# Altium footprint library Connectors_rus.PcbLib: 53 footprints (part 4 of 4)
Each footprint in its own frame and in the unit in brackets; x right, y up, seen from the top. Pads: shape width x height; smd on the part's side, far side on the other; paste and mask are expansions set on the pad; w line width, h text height; cw(c..) or ccw(c..) is an arc to the next point about the centre after c.
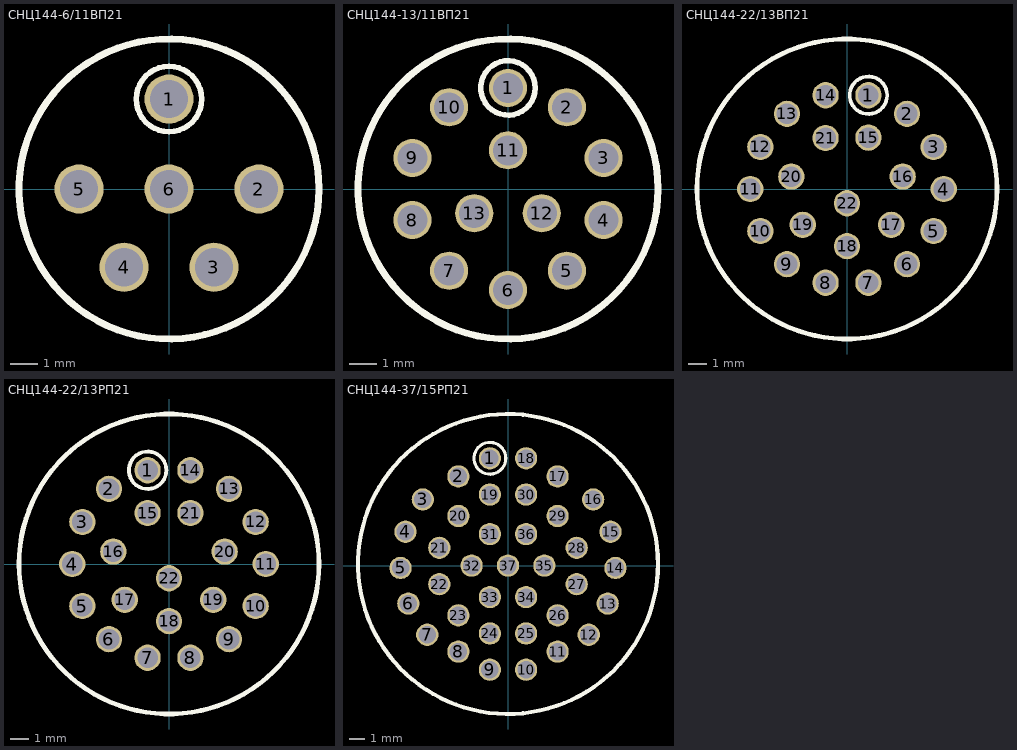
[diagram p3: the footprints below, top view; thin cyan lines are the x and y axes]

## СНЦ144-6/11ВП21 [mm]
pads (6):
  round 1.8 hole 1.4: 1(0,3.3) 2(3.3,0) 3(1.65,-2.87) 4(-1.65,-2.87) 5(-3.3,0) 6(0,0)
Top Overlay:
  circle w0.254: c0,0 r5.504
  circle w0.2: c0,3.3 r1.2
Bottom Overlay:
  circle w0.2: c0,3.3 r1.2
  text "6" at 0.173,1.07 h1.4
  text "5" at -3.139,1.07 h1.4
  text "4" at -1.441,-1.797 h1.4
  text "3" at 1.816,-1.796 h1.4
  text "2" at 3.475,1.07 h1.4
  text "1" at 0.173,4.814 h1.4
3D body "Вилка СНЦ144-6l11ВП21-NFПL.stp": height 31.9, standoff -4.6, extent -13.02,-13.15 13.18,13.05

## СНЦ144-13/11ВП21 [mm]
pads (13):
  round 1.4 hole 1.1: 1(0,3.71) 2(2.16,3) 3(3.51,1.14) 4(3.51,-1.14) 5(2.16,-3) 6(0,-3.71) 7(-2.16,-3) 8(-3.51,-1.14) 9(-3.51,1.14) 10(-2.16,3) 11(0,1.42) 12(1.24,-0.89) 13(-1.24,-0.89)
Top Overlay:
  circle w0.254: c0,0 r5.506
  circle w0.2: c0,3.71 r1
Bottom Overlay:
  circle w0.2: c0,3.71 r1
  text "1" at 0.278,4.904 h1.4
  text "2" at 3.238,3.846 h1.4
  text "6" at 0.201,-5.546 h1.4
  text "10" at -2.981,3.667 h1.4
  text "11" at 0.437,-0.325 h1.4
  text "12" at 2.307,0.037 h1.4
  text "13" at -1.259,0.043 h1.4
3D body "Вилка СНЦ144-13l11ВП21-NFПL.stp": height 4.6, standoff -31.9, extent -13.103,-13.092 13.097,13.108

## СНЦ144-22/13ВП21 [mm]
pads (22):
  round 1.4 hole 1.1: 1(1.14,5) 2(3.2,4.01) 3(4.62,2.24) 4(5.16,0) 5(4.62,-2.24) 6(3.2,-4.01) 7(1.14,-5) 8(-1.14,-5) 9(-3.2,-4.01) 10(-4.62,-2.24) 11(-5.16,0) 12(-4.62,2.24) 13(-3.2,4.01) 14(-1.14,5) 15(1.14,2.74) 16(2.97,0.66) 17(2.36,-1.91) 18(0,-3.05) 19(-2.36,-1.91) 20(-2.97,0.66) 21(-1.14,2.72) 22(0,-0.76)
Top Overlay:
  circle w0.254: c0,0 r8
  circle w0.2: c1.14,5 r1
Bottom Overlay:
  circle w0.2: c1.14,5 r1
  text "1" at 1.308,6.294 h1.4
  text "2" at 4.03,4.883 h1.4
  text "14" at -0.916,6.035 h1.4
  text "7" at 1.388,-7.022 h1.4
  text "8" at -1.052,-6.969 h1.4
  text "4" at 7.03,-0.385 h1.4
  text "11" at -6.262,-0.329 h1.4
  text "15" at 1.56,1.03 h1.4
  text "16" at 3.433,1.506 h1.4
  text "17" at 3.717,-1.429 h1.4
  text "18" at 1.812,-3.639 h1.4
  text "19" at -3.061,-1.418 h1.4
  text "20" at -2.483,1.461 h1.4
  text "21" at -0.67,0.996 h1.4
  text "22" at 0.477,0.1 h1.4
3D body "Вилка СНЦ144-22l13ВП21-NFПL.stp": height 4.6, standoff -31.9, extent -14.31,-14.298 14.29,14.302

## СНЦ144-22/13РП21 [mm]
pads (22):
  round 1.4 hole 1.1: 1(-1.14,5) 2(-3.2,4.01) 3(-4.62,2.24) 4(-5.16,0) 5(-4.62,-2.24) 6(-3.2,-4.01) 7(-1.14,-5) 8(1.14,-5) 9(3.2,-4.01) 10(4.62,-2.24) 11(5.16,0) 12(4.62,2.24) 13(3.2,4.01) 14(1.14,5) 15(-1.14,2.72) 16(-2.97,0.66) 17(-2.36,-1.91) 18(0,-3.05) 19(2.36,-1.91) 20(2.97,0.66) 21(1.14,2.72) 22(0,-0.76)
Top Overlay:
  circle w0.254: c0,0 r8
  circle w0.2: c-1.14,5 r1
Bottom Overlay:
  circle w0.2: c-1.14,5 r1
  text "1" at -0.927,6.294 h1.4
  text "14" at 1.634,6.043 h1.4
  text "8" at 1.358,-6.988 h1.4
  text "7" at -0.981,-6.916 h1.4
  text "4" at -6.525,-0.423 h1.4
  text "11" at 7.137,-0.487 h1.4
  text "22" at 0.598,0.096 h1.4
  text "20" at 3.49,1.566 h1.4
  text "16" at -2.551,1.574 h1.4
  text "19" at 3.809,-1.289 h1.4
  text "17" at -2.922,-1.443 h1.4
  text "18" at 1.75,-3.45 h1.4
  text "21" at 1.578,0.972 h1.4
  text "15" at -0.689,1.006 h1.4
3D body "Розетка СНЦ144-22l13РП21-NFПL.stp": height 4.6, standoff -31.9, extent -14.259,-14.305 14.341,14.295

## СНЦ144-37/15РП21 [mm]
pads (37):
  round 1.4 hole 1.1: 1(-1.14,6.75) 2(-3.12,5.61) 3(-5.36,4.16) 4(-6.45,2.13) 5(-6.76,-0.15) 6(-6.27,-2.39) 7(-5.08,-4.35) 8(-3.12,-5.41) 9(-1.14,-6.55) 10(1.14,-6.55) 11(3.12,-5.41) 12(5.08,-4.35) 13(6.27,-2.39) 14(6.76,-0.15) 15(6.45,2.13) 16(5.36,4.16) 17(3.12,5.61) 18(1.14,6.75) 19(-1.14,4.47) 20(-3.12,3.12) 21(-4.32,1.12) 22(-4.32,-1.17) 23(-3.12,-3.13) 24(-1.14,-4.27) 25(1.14,-4.27) 26(3.12,-3.13) 27(4.32,-1.17) 28(4.32,1.12) 29(3.12,3.12) 30(1.14,4.47) 31(-1.14,1.98) 32(-2.29,0) 33(-1.14,-1.98) 34(1.14,-1.98) 35(2.29,0) 36(1.14,1.98) 37(0,0)
Top Overlay:
  circle w0.2: c-1.14,6.75 r1
  circle w0.254: c0,0.1 r9.437
Bottom Overlay:
  circle w0.2: c-1.14,6.75 r1
  lines w0.15: -7.516,1.326 -5.354,1.131 ; -7.179,-1.332 -5.336,-1.101 ; -4.787,5.797 -3.618,3.98 ; -2.902,7.228 -1.755,5.218 ; -2.686,-6.626 -1.702,-5.064 ; 1.689,-5.162 2.575,-6.823 ; 1.737,5.484 2.462,6.965 ; 3.68,3.973 4.652,5.654 ; 5.369,1.104 7.453,1.309 ; 5.382,-1.103 7.29,-1.457
  text "1" at -0.907,8.051 h1.4
  text "18" at 1.322,8.051 h1.4
  text "14" at 8.884,-0.538 h1.4
  text "5" at -8,-0.532 h1.4
  text "10" at 1.457,-8.592 h1.4
  text "9" at -0.965,-8.586 h1.4
  text "19" at -2.777,7.274 h1.3
  text "20" at -4.719,5.956 h1.3
  text "24" at -2.855,-7.667 h1.3
  text "25" at 3.279,-7.737 h1.3
  text "27" at 8.607,-2.055 h1.3
  text "28" at 8.716,0.956 h1.3
  text "30" at 3.346,7.191 h1.3
  text "29" at 5.567,5.88 h1.3
  text "21" at -7.742,0.989 h1.3
  text "22" at -7.62,-1.824 h1.3
  text "31" at -0.683,2.751 h1.3
  text "32" at -1.823,0.802 h1.3
  text "33" at -0.641,-1.232 h1.3
  text "34" at 1.632,-1.232 h1.3
  text "35" at 2.866,0.768 h1.3
  text "36" at 1.625,2.828 h1.3
  text "37" at 0.513,0.752 h1.3
3D body "Розетка СНЦ144-37l15РП21-NFПL.stp": height 31.9, standoff -4.6, extent -15.52,-15.405 15.48,15.595